# Altium schematic symbol library MiscPower.SchLib: 1552 symbols (part 7 of 22)
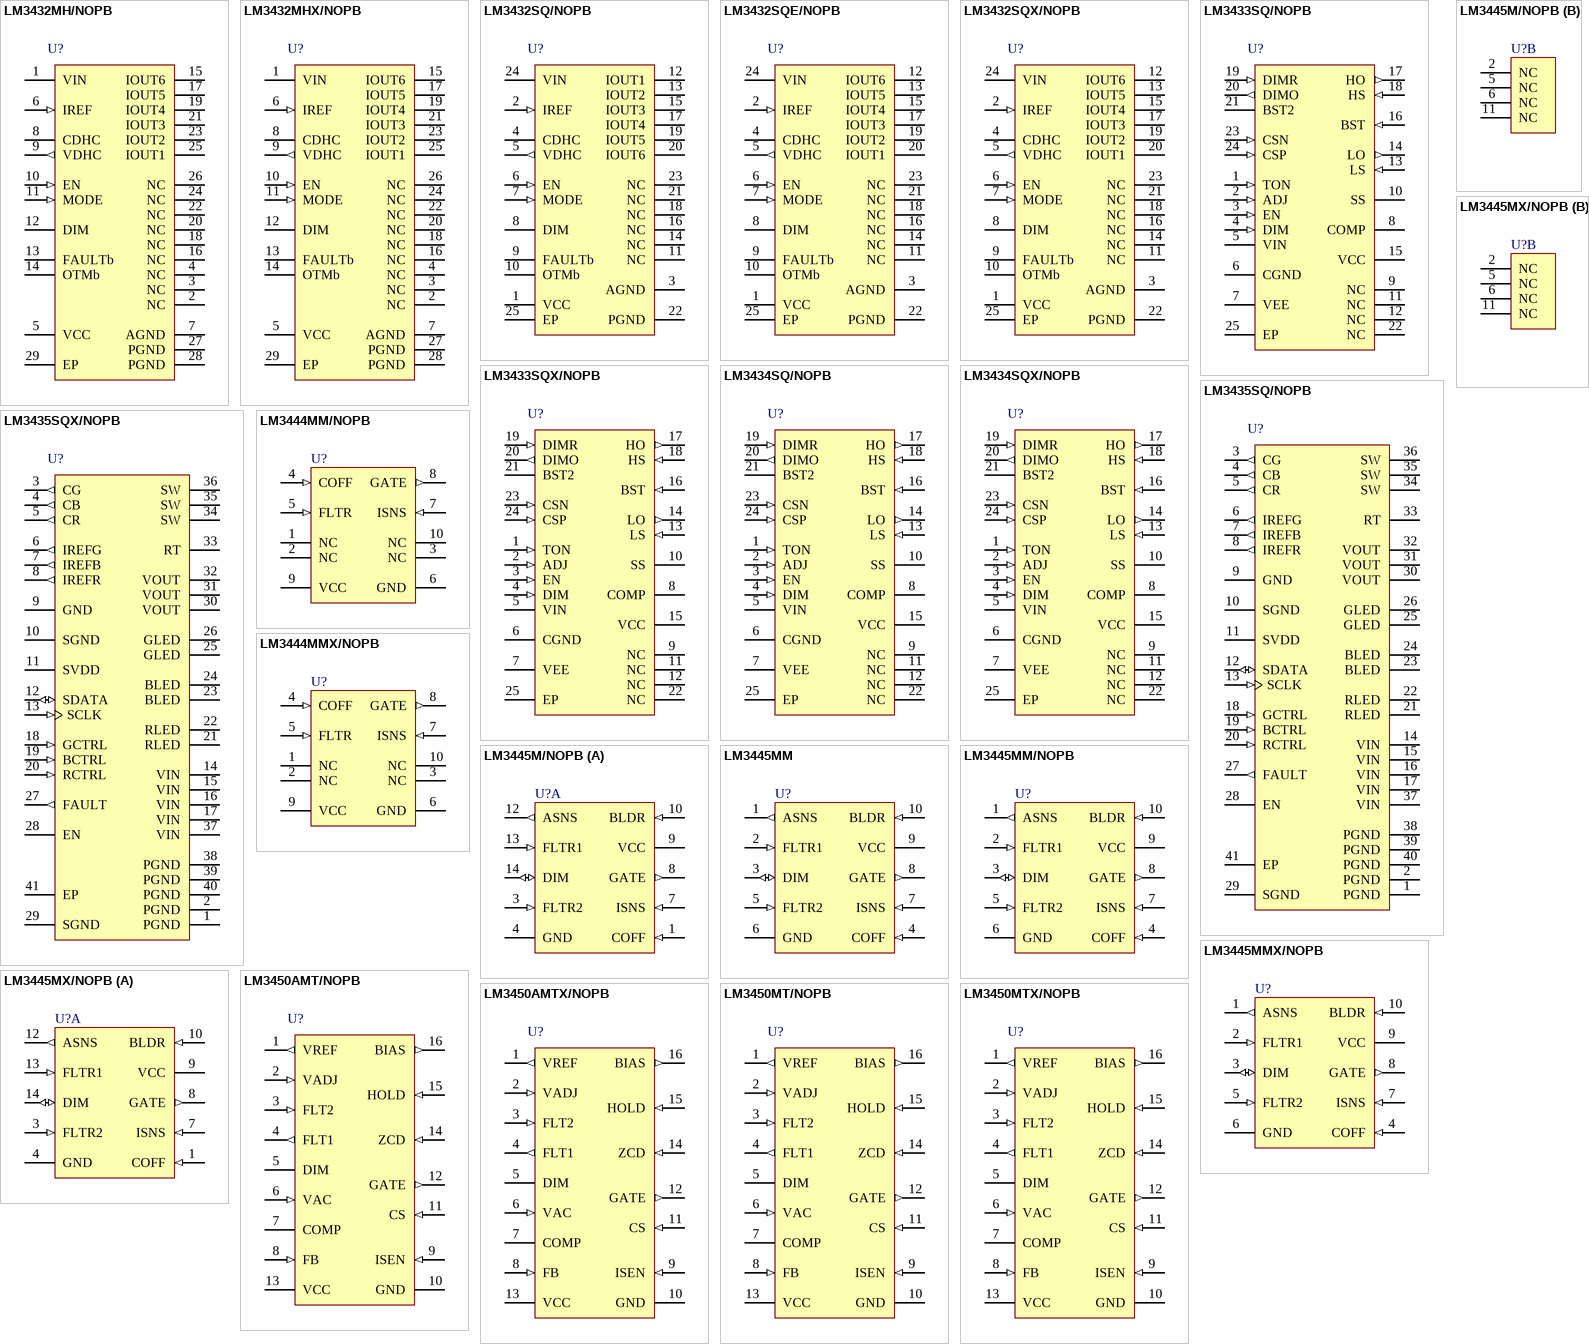
[diagram p63: symbols LM3432MH/NOPB to LM3450MTX/NOPB]

## LM3444MMX/NOPB
designator U?
AC-DC Offline LED Driver, 10-pin Mini SOIC, 3500 Reel; PartNumber: LM3444MMX/NOPB; Manufacturer: National Semiconductor; PackageTopMarking: ZXTT*SZTB; PowerWise: Y; CompType: MiscPower; DatasheetVersion: Jan-2011; PackageVersion: revB, Jul-2003; PackageReference: MUB10A; PackageDescription: Mini-SO, Molded, .118 x .118 x .034in Body, 10 Lead, .0197in Pitch; RoHS: Y; PinCount: 10; High-Reliability: Y; Code_JEDEC: MO-187-BA; ComponentLink1Description: Manufacturer URL; ComponentLink1URL: http://www.national.com/; ComponentLink2Description: LM3444 Datasheet; ComponentLink2URL: http://www.national.com/ds/LM/LM3444.pdf; ComponentLink3Description: LM3444 Web Page; ComponentLink3URL: http://www.national.com/pf/LM/LM3444.html; ComponentLink4Description: MUB10A Package Page; ComponentLink4URL: http://www.national.com/packaging/folders/mub10a.html
footprint MUB10A_N (TSSOP, 10-Leads, Body 3x3mm, Pitch 0.5mm, IPC Medium Density)
footprint MUB10A_L (TSSOP, 10-Leads, Body 3x3mm, Pitch 0.5mm, IPC High Density)
footprint MUB10A_M (TSSOP, 10-Leads, Body 3x3mm, Pitch 0.5mm, IPC Low Density)
pins: 1 NC, 2 NC, 3 NC, 4 COFF (in), 5 FLTR (in), 6 GND (power), 7 ISNS (in), 8 GATE (out), 9 VCC (power), 10 NC

## LM3445M/NOPB
designator U?
Triac Dimmable Offline LED Driver, 14-pin Narrow SOIC, Pb-Free; PartNumber: LM3445M/NOPB; Manufacturer: National Semiconductor; PackageTopMarking: NSUZXYTTE#*LM3445M; PowerWise: N; CompType: MiscPower; High-Reliability: Y; DatasheetVersion: Feb-2010; PackageVersion: revJ, Jan-1996; PackageReference: M14A; PackageDescription: Molded Package S.O., .150in Wide, 14 Lead; RoHS: Y; PinCount: 14; Code_JEDEC: MS-012AB; Code_IPC: SOIC127P600-14; ComponentLink1Description: Manufacturer URL; ComponentLink1URL: http://www.national.com/; ComponentLink2Description: LM3445 Datasheet; ComponentLink2URL: http://www.national.com/ds/LM/LM3445.pdf; ComponentLink3Description: LM3445 Web Page; ComponentLink3URL: http://www.national.com/pf/LM/LM3445.html; ComponentLink4Description: M14A Package Page; ComponentLink4URL: http://www.national.com/packaging/folders/m14a.html
footprint M14A_N (SOIC, 14-Leads, Body 8.6x3.9mm, Pitch 1.27mm, IPC Medium Density)
footprint M14A_L (SOIC, 14-Leads, Body 8.6x3.9mm, Pitch 1.27mm, IPC High Density)
footprint M14A_M (SOIC, 14-Leads, Body 8.6x3.9mm, Pitch 1.27mm, IPC Low Density)
part A pins: 1 COFF (in), 3 FLTR2 (in), 4 GND (power), 7 ISNS (in), 8 GATE (out), 9 VCC (power), 10 BLDR (in), 12 ASNS (out), 13 FLTR1 (in), 14 DIM (io)
part B pins: 2 NC, 5 NC, 6 NC, 11 NC

## LM3445MM
designator U?
Triac Dimmable Offline LED Driver, PowerWise, 10-pin MSOP; PartNumber: LM3445MM; Manufacturer: National Semiconductor; PackageTopMarking: ZXTT*SULB; PowerWise: Y; CompType: MiscPower; DatasheetVersion: Feb-2010; PackageVersion: revB, Jul-2003; PackageReference: MUB10A; PackageDescription: Mini-SO, Molded, .118 x .118 x .034in Body, 10 Lead, .0197in Pitch; RoHS: Y; PinCount: 10; High-Reliability: Y; Code_JEDEC: MO-187-BA; ComponentLink1Description: Manufacturer URL; ComponentLink1URL: http://www.national.com/; ComponentLink2Description: LM3445 Datasheet; ComponentLink2URL: http://www.national.com/ds/LM/LM3445.pdf; ComponentLink3Description: LM3445 Web Page; ComponentLink3URL: http://www.national.com/pf/LM/LM3445.html; ComponentLink4Description: MUB10A Package Page; ComponentLink4URL: http://www.national.com/packaging/folders/mub10a.html
footprint MUB10A_N (TSSOP, 10-Leads, Body 3x3mm, Pitch 0.5mm, IPC Medium Density)
footprint MUB10A_L (TSSOP, 10-Leads, Body 3x3mm, Pitch 0.5mm, IPC High Density)
footprint MUB10A_M (TSSOP, 10-Leads, Body 3x3mm, Pitch 0.5mm, IPC Low Density)
pins: 1 ASNS (out), 2 FLTR1 (in), 3 DIM (io), 4 COFF (in), 5 FLTR2 (in), 6 GND (power), 7 ISNS (in), 8 GATE (out), 9 VCC (power), 10 BLDR (in)

## LM3445MM/NOPB
designator U?
Triac Dimmable Offline LED Driver, 10-pin MSOP, Pb-Free; PartNumber: LM3445MM/NOPB; Manufacturer: National Semiconductor; PackageTopMarking: ZXTT*SULB; PowerWise: Y; CompType: MiscPower; DatasheetVersion: Feb-2010; PackageVersion: revB, Jul-2003; PackageReference: MUB10A; PackageDescription: Mini-SO, Molded, .118 x .118 x .034in Body, 10 Lead, .0197in Pitch; RoHS: Y; PinCount: 10; High-Reliability: Y; Code_JEDEC: MO-187-BA; ComponentLink1Description: Manufacturer URL; ComponentLink1URL: http://www.national.com/; ComponentLink2Description: LM3445 Datasheet; ComponentLink2URL: http://www.national.com/ds/LM/LM3445.pdf; ComponentLink3Description: LM3445 Web Page; ComponentLink3URL: http://www.national.com/pf/LM/LM3445.html; ComponentLink4Description: MUB10A Package Page; ComponentLink4URL: http://www.national.com/packaging/folders/mub10a.html
footprint MUB10A_N (TSSOP, 10-Leads, Body 3x3mm, Pitch 0.5mm, IPC Medium Density)
footprint MUB10A_L (TSSOP, 10-Leads, Body 3x3mm, Pitch 0.5mm, IPC High Density)
footprint MUB10A_M (TSSOP, 10-Leads, Body 3x3mm, Pitch 0.5mm, IPC Low Density)
pins: 1 ASNS (out), 2 FLTR1 (in), 3 DIM (io), 4 COFF (in), 5 FLTR2 (in), 6 GND (power), 7 ISNS (in), 8 GATE (out), 9 VCC (power), 10 BLDR (in)

## LM3445MMX/NOPB
designator U?
Triac Dimmable Offline LED Driver, 10-pin MSOP, Pb-Free; PartNumber: LM3445MMX/NOPB; Manufacturer: National Semiconductor; PackageTopMarking: ZXTT*SULB; PowerWise: Y; CompType: MiscPower; DatasheetVersion: Feb-2010; PackageVersion: revB, Jul-2003; PackageReference: MUB10A; PackageDescription: Mini-SO, Molded, .118 x .118 x .034in Body, 10 Lead, .0197in Pitch; RoHS: Y; PinCount: 10; High-Reliability: Y; Code_JEDEC: MO-187-BA; ComponentLink1Description: Manufacturer URL; ComponentLink1URL: http://www.national.com/; ComponentLink2Description: LM3445 Datasheet; ComponentLink2URL: http://www.national.com/ds/LM/LM3445.pdf; ComponentLink3Description: LM3445 Web Page; ComponentLink3URL: http://www.national.com/pf/LM/LM3445.html; ComponentLink4Description: MUB10A Package Page; ComponentLink4URL: http://www.national.com/packaging/folders/mub10a.html
footprint MUB10A_N (TSSOP, 10-Leads, Body 3x3mm, Pitch 0.5mm, IPC Medium Density)
footprint MUB10A_L (TSSOP, 10-Leads, Body 3x3mm, Pitch 0.5mm, IPC High Density)
footprint MUB10A_M (TSSOP, 10-Leads, Body 3x3mm, Pitch 0.5mm, IPC Low Density)
pins: 1 ASNS (out), 2 FLTR1 (in), 3 DIM (io), 4 COFF (in), 5 FLTR2 (in), 6 GND (power), 7 ISNS (in), 8 GATE (out), 9 VCC (power), 10 BLDR (in)

## LM3445MX/NOPB
designator U?
Triac Dimmable Offline LED Driver, 14-pin Narrow SOIC, Pb-Free; PartNumber: LM3445MX/NOPB; Manufacturer: National Semiconductor; PackageTopMarking: NSUZXYTTE#*LM3445M; PowerWise: N; CompType: MiscPower; High-Reliability: Y; DatasheetVersion: Feb-2010; PackageVersion: revJ, Jan-1996; PackageReference: M14A; PackageDescription: Molded Package S.O., .150in Wide, 14 Lead; RoHS: Y; PinCount: 14; Code_JEDEC: MS-012AB; Code_IPC: SOIC127P600-14; ComponentLink1Description: Manufacturer URL; ComponentLink1URL: http://www.national.com/; ComponentLink2Description: LM3445 Datasheet; ComponentLink2URL: http://www.national.com/ds/LM/LM3445.pdf; ComponentLink3Description: LM3445 Web Page; ComponentLink3URL: http://www.national.com/pf/LM/LM3445.html; ComponentLink4Description: M14A Package Page; ComponentLink4URL: http://www.national.com/packaging/folders/m14a.html
footprint M14A_N (SOIC, 14-Leads, Body 8.6x3.9mm, Pitch 1.27mm, IPC Medium Density)
footprint M14A_L (SOIC, 14-Leads, Body 8.6x3.9mm, Pitch 1.27mm, IPC High Density)
footprint M14A_M (SOIC, 14-Leads, Body 8.6x3.9mm, Pitch 1.27mm, IPC Low Density)
part A pins: 1 COFF (in), 3 FLTR2 (in), 4 GND (power), 7 ISNS (in), 8 GATE (out), 9 VCC (power), 10 BLDR (in), 12 ASNS (out), 13 FLTR1 (in), 14 DIM (io)
part B pins: 2 NC, 5 NC, 6 NC, 11 NC

## LM3450AMT/NOPB
designator U?
LED Drivers with Active Power Factor Correction and Phase Dimming Decoder, 16-pin TSSOP, Pb-Free, 92 Rail; PartNumber: LM3450AMT/NOPB; Manufacturer: National Semiconductor; PackageTopMarking: NSUZXYTT*LM3450*AMT; PowerWise: N; CompType: MiscPower; High-Reliability: Y; DatasheetVersion: Jun-2011; PackageVersion: revD, Jun-2003; PackageReference: MTC16; PackageDescription: Molded TSSOP, Jedec, 5 x 4.4 x 0.9mm Body, 16 Lead, 0.65mm Pitch; RoHS: Y; PinCount: 16; Code_JEDEC: MO-153-AB; ComponentLink1Description: Manufacturer URL; ComponentLink1URL: http://www.national.com/; ComponentLink2Description: LM3450 Datasheet; ComponentLink2URL: http://www.national.com/ds/LM/LM3450.pdf; ComponentLink3Description: LM3450 Web Page; ComponentLink3URL: http://www.national.com/pf/LM/LM3450.html; ComponentLink4Description: MTC16 Package Page; ComponentLink4URL: http://www.national.com/packaging/folders/mtc16.html
footprint MTC16_N (TSOP, 16-Leads, Body 5x4.4mm, Pitch 0.65mm, IPC Medium Density)
footprint MTC16_L (TSOP, 16-Leads, Body 5x4.4mm, Pitch 0.65mm, IPC High Density)
footprint MTC16_M (TSOP, 16-Leads, Body 5x4.4mm, Pitch 0.65mm, IPC Low Density)
pins: 1 VREF (out), 2 VADJ (in), 3 FLT2 (in), 4 FLT1 (out), 5 DIM (oc), 6 VAC (in), 7 COMP, 8 FB (in), 9 ISEN (in), 10 GND (power), 11 CS (in), 12 GATE (out), 13 VCC (power), 14 ZCD (in), 15 HOLD (in), 16 BIAS (out)

## LM3450AMTX/NOPB
designator U?
LED Drivers with Active Power Factor Correction and Phase Dimming Decoder, 16-pin TSSOP, Pb-Free, 2500 Reel; PartNumber: LM3450AMTX/NOPB; Manufacturer: National Semiconductor; PackageTopMarking: NSUZXYTT*LM3450*AMT; PowerWise: N; CompType: MiscPower; High-Reliability: Y; DatasheetVersion: Jun-2011; PackageVersion: revD, Jun-2003; PackageReference: MTC16; PackageDescription: Molded TSSOP, Jedec, 5 x 4.4 x 0.9mm Body, 16 Lead, 0.65mm Pitch; RoHS: Y; PinCount: 16; Code_JEDEC: MO-153-AB; ComponentLink1Description: Manufacturer URL; ComponentLink1URL: http://www.national.com/; ComponentLink2Description: LM3450 Datasheet; ComponentLink2URL: http://www.national.com/ds/LM/LM3450.pdf; ComponentLink3Description: LM3450 Web Page; ComponentLink3URL: http://www.national.com/pf/LM/LM3450.html; ComponentLink4Description: MTC16 Package Page; ComponentLink4URL: http://www.national.com/packaging/folders/mtc16.html
footprint MTC16_N (TSOP, 16-Leads, Body 5x4.4mm, Pitch 0.65mm, IPC Medium Density)
footprint MTC16_L (TSOP, 16-Leads, Body 5x4.4mm, Pitch 0.65mm, IPC High Density)
footprint MTC16_M (TSOP, 16-Leads, Body 5x4.4mm, Pitch 0.65mm, IPC Low Density)
pins: 1 VREF (out), 2 VADJ (in), 3 FLT2 (in), 4 FLT1 (out), 5 DIM (oc), 6 VAC (in), 7 COMP, 8 FB (in), 9 ISEN (in), 10 GND (power), 11 CS (in), 12 GATE (out), 13 VCC (power), 14 ZCD (in), 15 HOLD (in), 16 BIAS (out)

## LM3450MT/NOPB
designator U?
LED Driver with Active Power Factor Correction and Phase Dimming Decoder, 16-pin TSSOP, 92 Rail; PartNumber: LM3450MT/NOPB; Manufacturer: National Semiconductor; PackageTopMarking: NSUZXYTT*LM3450*MT; PowerWise: Y; CompType: MiscPower; DatasheetVersion: Jun-2011; PackageVersion: revD, Jun-2003; PackageReference: MTC16; PackageDescription: Molded TSSOP, Jedec, 5 x 4.4 x 0.9mm Body, 16 Lead, 0.65mm Pitch; RoHS: Y; PinCount: 16; High-Reliability: Y; Code_JEDEC: MO-153-AB; ComponentLink1Description: Manufacturer URL; ComponentLink1URL: http://www.national.com/; ComponentLink2Description: LM3450 Datasheet; ComponentLink2URL: http://www.national.com/ds/LM/LM3450.pdf; ComponentLink3Description: LM3450 Web Page; ComponentLink3URL: http://www.national.com/pf/LM/LM3450.html; ComponentLink4Description: MTC16 Package Page; ComponentLink4URL: http://www.national.com/packaging/folders/mtc16.html
footprint MTC16_N (TSOP, 16-Leads, Body 5x4.4mm, Pitch 0.65mm, IPC Medium Density)
footprint MTC16_L (TSOP, 16-Leads, Body 5x4.4mm, Pitch 0.65mm, IPC High Density)
footprint MTC16_M (TSOP, 16-Leads, Body 5x4.4mm, Pitch 0.65mm, IPC Low Density)
pins: 1 VREF (out), 2 VADJ (in), 3 FLT2 (in), 4 FLT1 (out), 5 DIM (oc), 6 VAC (in), 7 COMP, 8 FB (in), 9 ISEN (in), 10 GND (power), 11 CS (in), 12 GATE (out), 13 VCC (power), 14 ZCD (in), 15 HOLD (in), 16 BIAS (out)

## LM3450MTX/NOPB
designator U?
LED Driver with Active Power Factor Correction and Phase Dimming Decoder, 16-pin TSSOP, 2500 Reel; PartNumber: LM3450MTX/NOPB; Manufacturer: National Semiconductor; PackageTopMarking: NSUZXYTT*LM3450*MT; PowerWise: Y; CompType: MiscPower; DatasheetVersion: Jun-2011; PackageVersion: revD, Jun-2003; PackageReference: MTC16; PackageDescription: Molded TSSOP, Jedec, 5 x 4.4 x 0.9mm Body, 16 Lead, 0.65mm Pitch; RoHS: Y; PinCount: 16; High-Reliability: Y; Code_JEDEC: MO-153-AB; ComponentLink1Description: Manufacturer URL; ComponentLink1URL: http://www.national.com/; ComponentLink2Description: LM3450 Datasheet; ComponentLink2URL: http://www.national.com/ds/LM/LM3450.pdf; ComponentLink3Description: LM3450 Web Page; ComponentLink3URL: http://www.national.com/pf/LM/LM3450.html; ComponentLink4Description: MTC16 Package Page; ComponentLink4URL: http://www.national.com/packaging/folders/mtc16.html
footprint MTC16_N (TSOP, 16-Leads, Body 5x4.4mm, Pitch 0.65mm, IPC Medium Density)
footprint MTC16_L (TSOP, 16-Leads, Body 5x4.4mm, Pitch 0.65mm, IPC High Density)
footprint MTC16_M (TSOP, 16-Leads, Body 5x4.4mm, Pitch 0.65mm, IPC Low Density)
pins: 1 VREF (out), 2 VADJ (in), 3 FLT2 (in), 4 FLT1 (out), 5 DIM (oc), 6 VAC (in), 7 COMP, 8 FB (in), 9 ISEN (in), 10 GND (power), 11 CS (in), 12 GATE (out), 13 VCC (power), 14 ZCD (in), 15 HOLD (in), 16 BIAS (out)

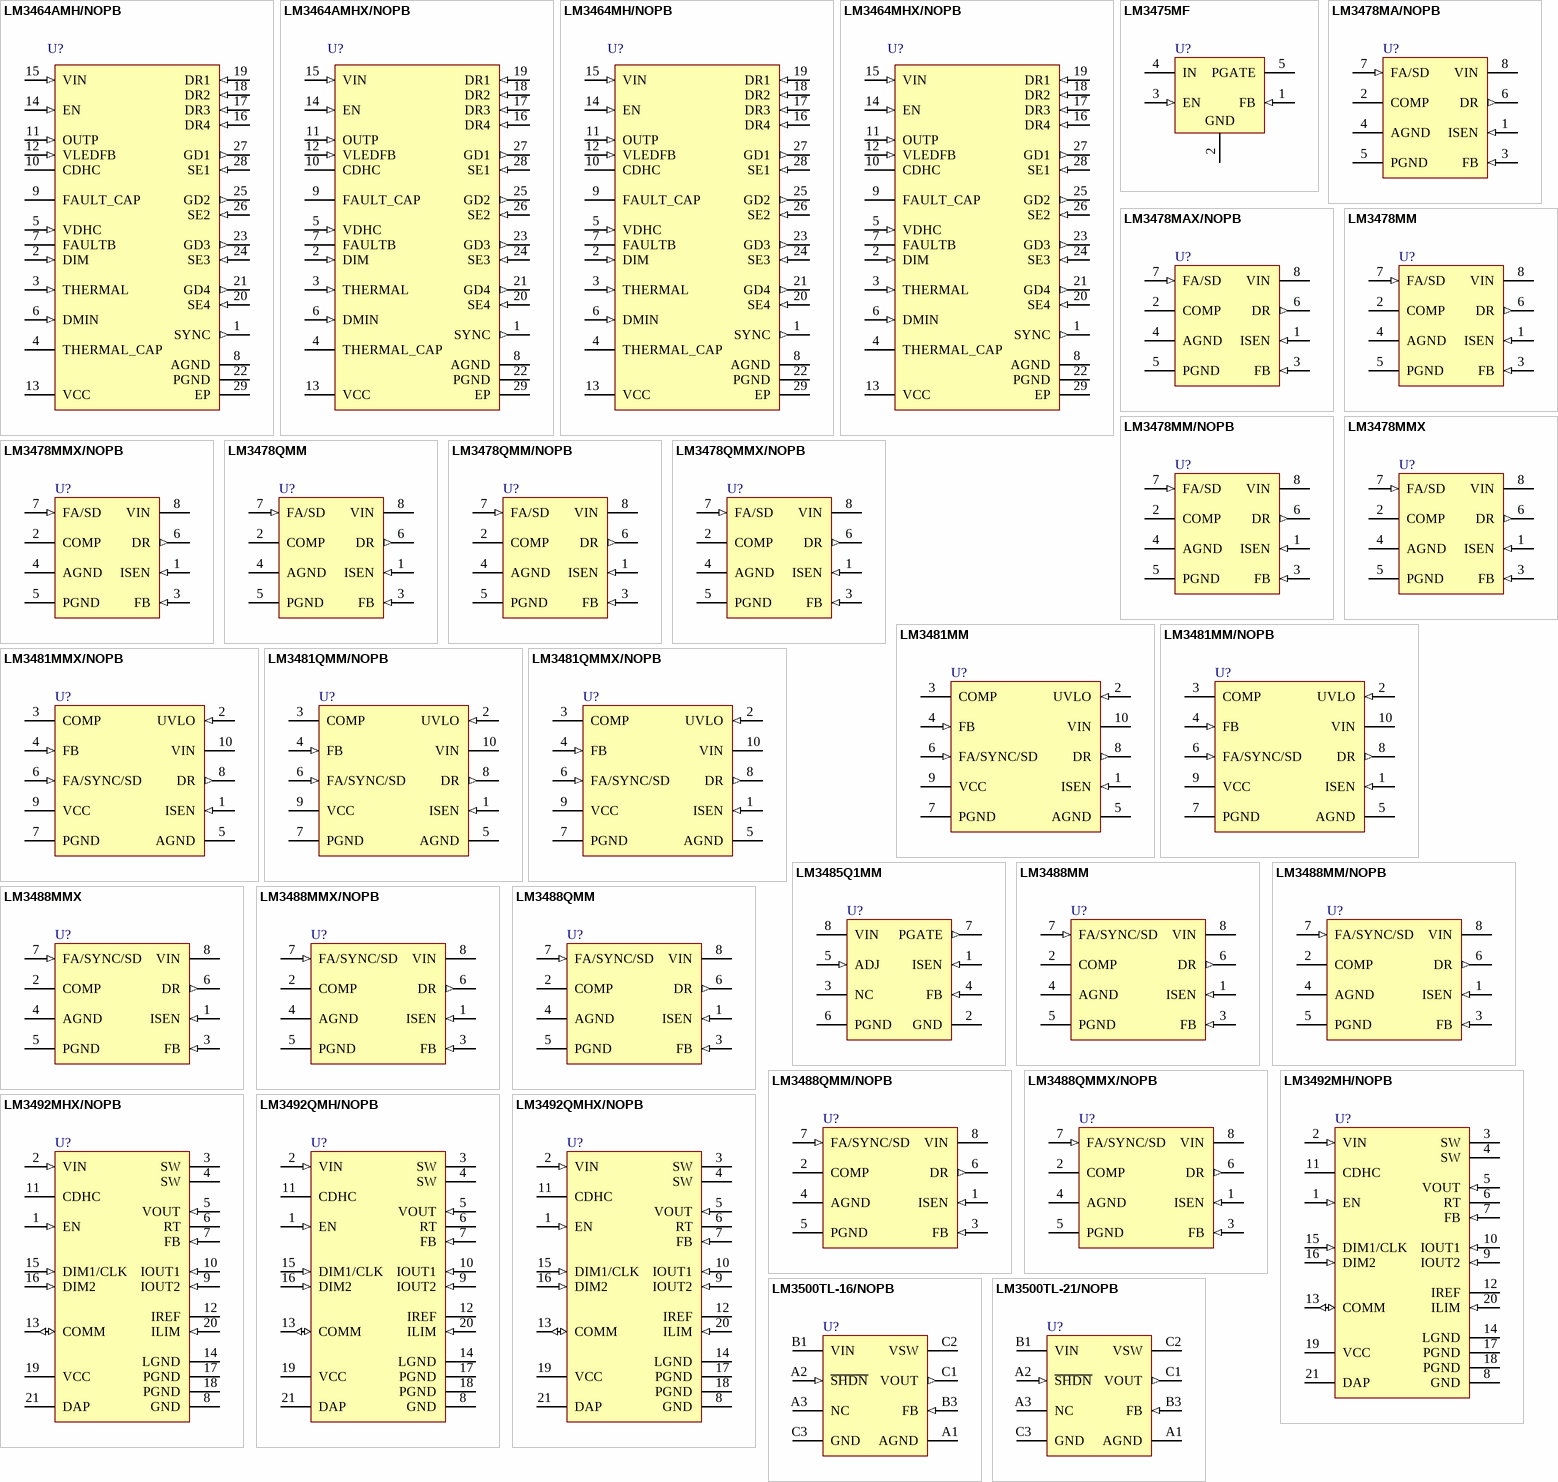
[diagram p14: symbols LM3464AMH/NOPB to LM3500TL-21/NOPB]

## LM3464AMH/NOPB
designator U?
LED Driver with Dynamic Headroom Control and Thermal Control Interfaces, 12-95V input, 28-pin TSSOP-EP, 48 Rail; PartNumber: LM3464AMH/NOPB; Manufacturer: National Semiconductor; PackageTopMarking: NSUZXYTTE#*LM3464AMH; PowerWise: N; CompType: MiscPower; High-Reliability: Y; DatasheetVersion: Jun-2011; PackageVersion: revD, Oct-2003; PackageReference: MXA28A; PackageDescription: Molded TSSOP, Jedec, 9.7 x 4.4 x 0.9mm Body, 28 Lead, 0.65mm Pitch, Exposed Pad; RoHS: Y; PinCount: 28; Code_JEDEC: MO-153-AET; ComponentLink1Description: Manufacturer URL; ComponentLink1URL: http://www.national.com/; ComponentLink2Description: LM3464 Datasheet; ComponentLink2URL: http://www.national.com/ds/LM/LM3464A.pdf; ComponentLink3Description: LM3464 Web Page; ComponentLink3URL: http://www.national.com/pf/LM/LM3464A.html; ComponentLink4Description: MXA28A Package Page; ComponentLink4URL: http://www.national.com/packaging/folders/mxa28a.html
footprint MXA28A_N (TSOP, 28-Leads, Body 9.7x4.4mm, Pitch 0.65mm, Thermal Pad, IPC Medium Density)
footprint MXA28A_L (TSOP, 28-Leads, Body 9.7x4.4mm, Pitch 0.65mm, Thermal Pad, IPC High Density)
footprint MXA28A_M (TSOP, 28-Leads, Body 9.7x4.4mm, Pitch 0.65mm, Thermal Pad, IPC Low Density)
pins: 1 SYNC (out), 2 DIM (in), 3 THERMAL (in), 4 THERMAL_CAP, 5 VDHC (in), 6 DMIN (in), 7 FAULTB (oc), 8 AGND (power), 9 FAULT_CAP, 10 CDHC, 11 OUTP (in), 12 VLEDFB (in), 13 VCC (power), 14 EN (in), 15 VIN (in), 16 DR4 (in), 17 DR3 (in), 18 DR2 (in), 19 DR1 (in), 20 SE4 (in), 21 GD4 (out), 22 PGND (power), 23 GD3 (out), 24 SE3 (in), 25 GD2 (out), 26 SE2 (in), 27 GD1 (out), 28 SE1 (in), 29 EP (power)

## LM3464AMHX/NOPB
designator U?
LED Driver with Dynamic Headroom Control and Thermal Control Interfaces, 12-95V input, 28-pin TSSOP-EP, 2500 Reel; PartNumber: LM3464AMHX/NOPB; Manufacturer: National Semiconductor; PackageTopMarking: NSUZXYTTE#*LM3464AMH; PowerWise: N; CompType: MiscPower; High-Reliability: Y; DatasheetVersion: Jun-2011; PackageVersion: revD, Oct-2003; PackageReference: MXA28A; PackageDescription: Molded TSSOP, Jedec, 9.7 x 4.4 x 0.9mm Body, 28 Lead, 0.65mm Pitch, Exposed Pad; RoHS: Y; PinCount: 28; Code_JEDEC: MO-153-AET; ComponentLink1Description: Manufacturer URL; ComponentLink1URL: http://www.national.com/; ComponentLink2Description: LM3464 Datasheet; ComponentLink2URL: http://www.national.com/ds/LM/LM3464A.pdf; ComponentLink3Description: LM3464 Web Page; ComponentLink3URL: http://www.national.com/pf/LM/LM3464A.html; ComponentLink4Description: MXA28A Package Page; ComponentLink4URL: http://www.national.com/packaging/folders/mxa28a.html
footprint MXA28A_N (TSOP, 28-Leads, Body 9.7x4.4mm, Pitch 0.65mm, Thermal Pad, IPC Medium Density)
footprint MXA28A_L (TSOP, 28-Leads, Body 9.7x4.4mm, Pitch 0.65mm, Thermal Pad, IPC High Density)
footprint MXA28A_M (TSOP, 28-Leads, Body 9.7x4.4mm, Pitch 0.65mm, Thermal Pad, IPC Low Density)
pins: 1 SYNC (out), 2 DIM (in), 3 THERMAL (in), 4 THERMAL_CAP, 5 VDHC (in), 6 DMIN (in), 7 FAULTB (oc), 8 AGND (power), 9 FAULT_CAP, 10 CDHC, 11 OUTP (in), 12 VLEDFB (in), 13 VCC (power), 14 EN (in), 15 VIN (in), 16 DR4 (in), 17 DR3 (in), 18 DR2 (in), 19 DR1 (in), 20 SE4 (in), 21 GD4 (out), 22 PGND (power), 23 GD3 (out), 24 SE3 (in), 25 GD2 (out), 26 SE2 (in), 27 GD1 (out), 28 SE1 (in), 29 EP (power)

## LM3464MH/NOPB
designator U?
LED Driver with Dynamic Headroom Control and Thermal Control Interfaces, 28 pin TSSOP EXP PAD; PartNumber: LM3464MH/NOPB; Manufacturer: National Semiconductor; PackageTopMarking: NSUZXYTTE#*LM3464MH; PowerWise: Y; CompType: MiscPower; DatasheetVersion: Apr-2011; PackageVersion: revD, Oct-2003; PackageReference: MXA28A; PackageDescription: Molded TSSOP, Jedec, 9.7 x 4.4 x 0.9mm Body, 28 Lead, 0.65mm Pitch, Exposed Pad; RoHS: Y; PinCount: 28; High-Reliability: Y; Code_JEDEC: MO-153-AET; ComponentLink1Description: Manufacturer URL; ComponentLink1URL: http://www.national.com/; ComponentLink2Description: LM3464 Datasheet; ComponentLink2URL: http://www.national.com/ds/LM/LM3464.pdf; ComponentLink3Description: LM3464 Web Page; ComponentLink3URL: http://www.national.com/pf/LM/LM3464.html; ComponentLink4Description: MXA28A Package Page; ComponentLink4URL: http://www.national.com/packaging/folders/mxa28a.html
footprint MXA28A_N (TSOP, 28-Leads, Body 9.7x4.4mm, Pitch 0.65mm, Thermal Pad, IPC Medium Density)
footprint MXA28A_L (TSOP, 28-Leads, Body 9.7x4.4mm, Pitch 0.65mm, Thermal Pad, IPC High Density)
footprint MXA28A_M (TSOP, 28-Leads, Body 9.7x4.4mm, Pitch 0.65mm, Thermal Pad, IPC Low Density)
pins: 1 SYNC (out), 2 DIM (in), 3 THERMAL (in), 4 THERMAL_CAP, 5 VDHC (in), 6 DMIN (in), 7 FAULTB (oc), 8 AGND (power), 9 FAULT_CAP, 10 CDHC, 11 OUTP (in), 12 VLEDFB (in), 13 VCC (power), 14 EN (in), 15 VIN (in), 16 DR4 (in), 17 DR3 (in), 18 DR2 (in), 19 DR1 (in), 20 SE4 (in), 21 GD4 (out), 22 PGND (power), 23 GD3 (out), 24 SE3 (in), 25 GD2 (out), 26 SE2 (in), 27 GD1 (out), 28 SE1 (in), 29 EP (power)

## LM3464MHX/NOPB
designator U?